# Altium footprint library Udemy_PCB_LIB.PcbLib: 35 footprints (part 1 of 3)
Each footprint in its own frame and in the unit in brackets; x right, y up, seen from the top. Pads: shape width x height; smd on the part's side, far side on the other; paste and mask are expansions set on the pad; w line width, h text height; cw(c..) or ccw(c..) is an arc to the next point about the centre after c.
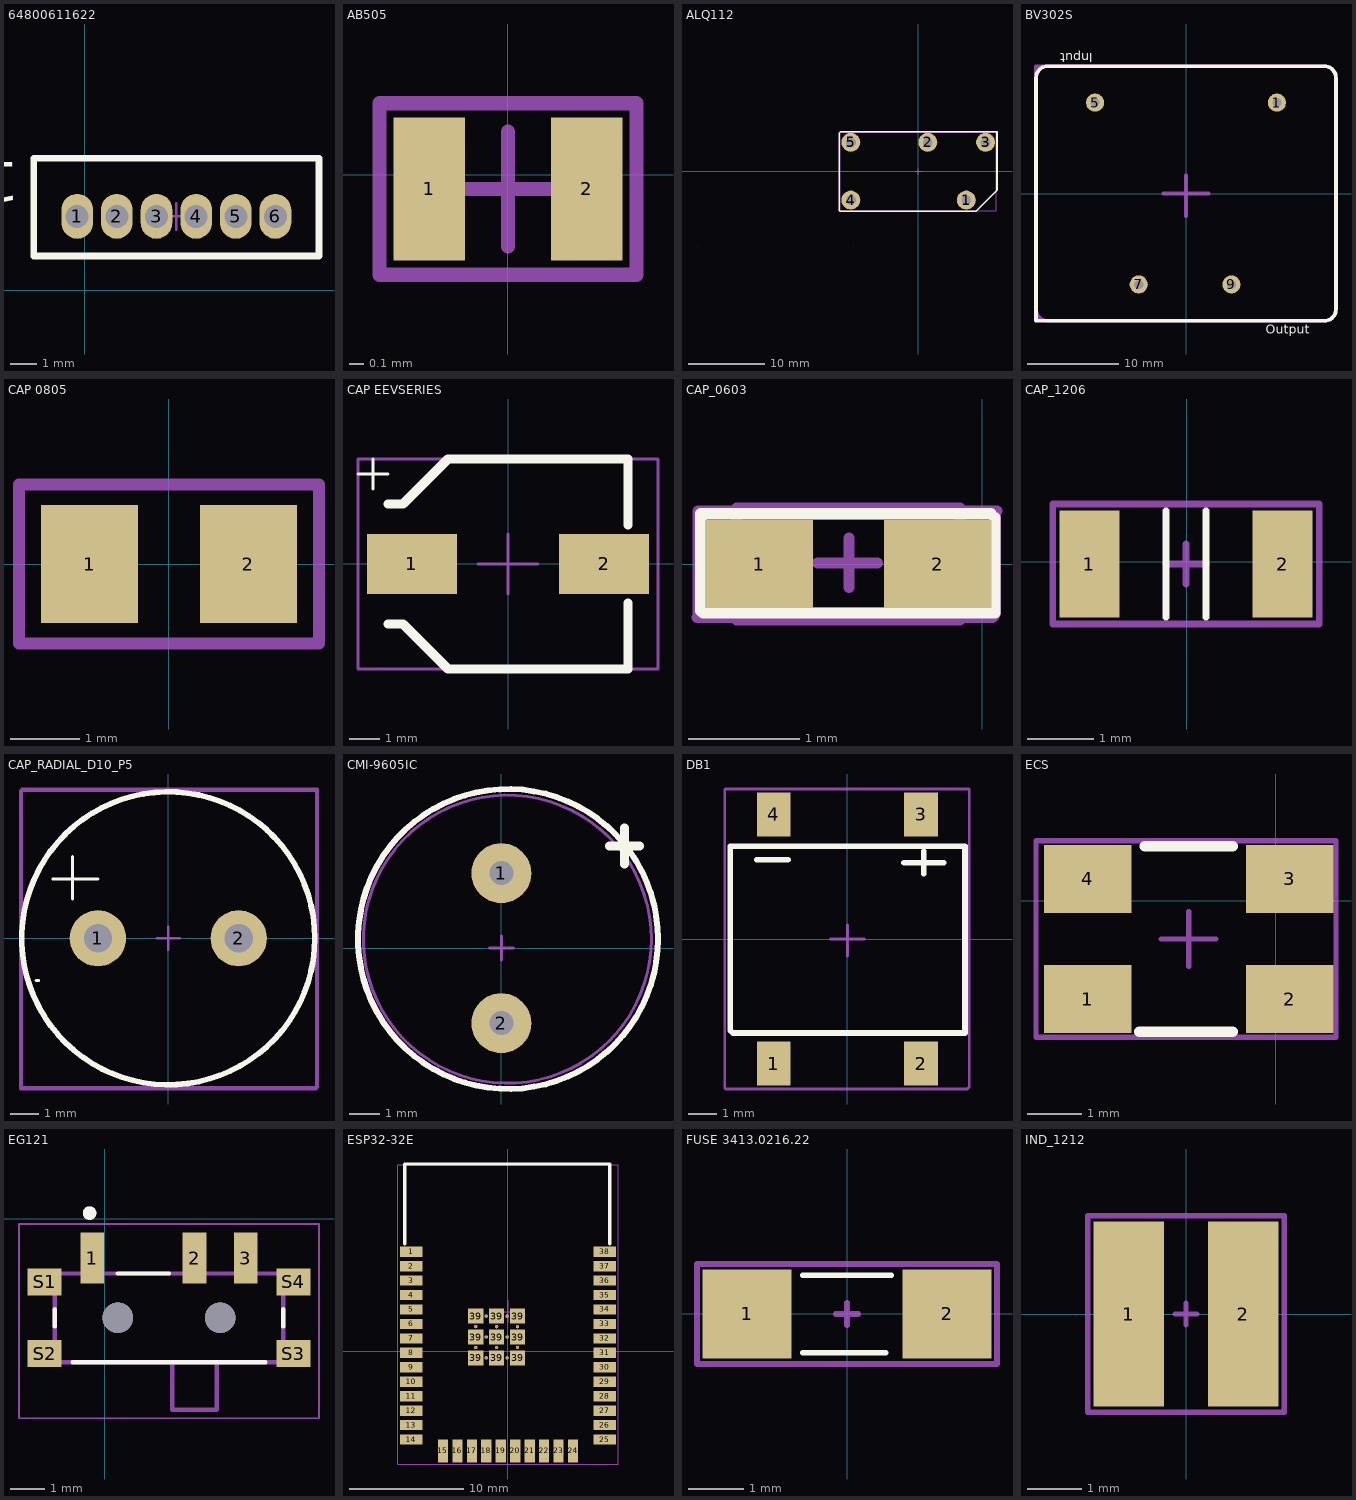
[diagram p0: the footprints below, top view; thin cyan lines are the x and y axes]

## 64800611622 [mm]
pads (6):
  oval 1.2x1.7 hole 0.87 mask+0.05: 1(-0.289,2.798) 2(1.211,2.798) 3(2.711,2.798) 4(4.211,2.798) 5(5.711,2.798) 6(7.211,2.798)
Top Overlay:
  lines w0.25: -1.939,1.298 -1.939,4.998 8.861,4.998 8.861,1.298 -1.939,1.298
  text "1" at -2.493,4.844 h1.52
Top 3D Body:
  lines w0.1: 2.961,2.798 3.961,2.798 ; 3.461,2.298 3.461,3.298 ; -1.939,1.298 8.861,1.298 8.861,4.998 -1.939,4.998 -1.939,1.298
Bottom Designator:
  lines w0.1: -1.939,1.298 -1.939,4.998 8.861,4.998 8.861,1.298 -1.939,1.298
  text "'.Designator'" at -0.585,2.56 h1.52
3D body "64800611622 (rev1).stp": height 4.75, standoff -2.45, extent -1.789,1.398 8.711,4.898

## AB505 [mm]
pads (2):
  rect 0.5x1 smd mask+0.05: 1(-0.55,-0.1) 2(0.55,-0.1)
Top 3D Body:
  lines w0.1: -0.4,-0.1 0.4,-0.1 ; 0,-0.5 0,0.3 ; -0.9,-0.7 0.9,-0.7 0.9,0.5 -0.9,0.5 -0.9,-0.7
Bottom Designator:
  lines w0.1: -0.9,-0.7 0.9,-0.7 0.9,0.5 -0.9,0.5 -0.9,-0.7
  text "'.Designator'" at -1,-0.467 h0.7
3D body "ABS05.STEP": height 0.5, standoff 0, extent -0.8,-0.6 0.8,0.4

## ALQ112 [mm]
pads (5):
  round 2.5 hole 1.3: 1(6.35,-3.81) 2(1.27,3.81) 3(8.89,3.81) 4(-8.89,-3.81) 5(-8.89,3.81)
Top Overlay:
  lines w0.2: -10.4,5.1 -10.4,-5.2 -10.3,-5.3 7.6,-5.3 10.4,-2.5 10.4,5.2 -10.3,5.2
Top Component Center:
  lines w0.1: -29.19,-9.89 -29.187,-9.893 ; -8.593,-9.893 -8.59,-9.89 ; -0.3,0 0.2,0 ; 0,-0.3 0,0.3 ; -10.29,-5.19 -10.287,-5.193 10.307,-5.193 10.31,-5.19 10.31,5.11 -9.99,5.11 -10.29,5.11 -10.29,-5.19
Top Designator:
  lines w0.1: -10.29,-5.19 -10.29,5.11 -9.99,5.11 10.31,5.11 10.31,-5.19 ; -10.287,-5.193 10.307,-5.193 ; -0.4,0 0.5,0 ; 0,-0.4 0,0.3
  text ".Designator" at -5.746,-0.438 h1.52
3D body: height 15.6, standoff 0.4, extent 8.01,-3.99 9.01,-2.99
3D body: height 0.45, standoff -3.75, extent -9.29,3.41 -8.49,4.21
3D body: height 0.45, standoff -3.75, extent -9.29,-4.21 -8.49,-3.41
3D body: height 0.2, standoff -4, extent -8.89,3.81 -8.09,3.81
3D body: height 0.2, standoff -4, extent 0.87,3.66 1.67,3.96
3D body: height 0.2, standoff -4, extent 0.87,3.96 1.67,4.26
3D body: height 0.2, standoff -4, extent 8.49,3.66 9.29,3.96
3D body: height 0.2, standoff -4, extent 5.95,-3.96 6.75,-3.66
3D body: height 15.6, standoff 0.4, extent -10,-5 10,5

## BV302S [mm]
pads (4):
  round 2 hole 1: 1(10,10) 5(-10,10) 7(-5.2,-10) 9(5,-10)
Top Overlay:
  lines w0.4: -16.5,-14 15.23,-14 ccw(c15.23,-12.73) 16.5,-12.73 16.5,12.73 ccw(c15.23,12.73) 15.23,14 -15.23,14 ccw(c-15.23,12.73) -16.5,12.73 -16.5,-14
  text "Output" at 8.754,-15.413 h1
  text "Input" at -10.254,15.413 h1
Top Component Center:
  lines w0.1: -16.5,-12.73 ccw(c-15.23,-12.73) -15.23,-14 15.23,-14 ccw(c15.23,-12.73) 16.5,-12.73 16.5,12.73 ccw(c15.23,12.73) 15.23,14 -16,14 ccw(c-16,13.5) -16.5,13.5 -16.5,-12.73
  lines w0.4: -2.5,0 2.5,0 ; 0,-2.5 0,2
Top Designator:
  lines w0.4: -16.5,-12.73 ccw(c-15.23,-12.73) -15.23,-14 15.23,-14 ccw(c15.23,-12.73) 16.5,-12.73 16.5,12.73 ccw(c15.23,12.73) 15.23,14 -16.5,14 -16.5,-12.73
  text ".Designator" at -8.1,-1.1 h3
3D body "User Library-Hahn BV EI 302 2902.step": height 21.8, standoff -4.5, extent -16.25,-13.75 16.25,13.75

## CAP 0805 [mm]
pads (2):
  rect 1.4x1.7 smd: 1(-1.143,0) 2(1.143,0)
Mechanical 13:
  lines w0.175: -2.159,-1.143 -2.159,1.143 2.159,1.143 2.159,-1.143 -2.159,-1.143
  text "'.Designator'" at -5.665,-0.417 h1
3D body "C0805.stp": height 1.01, standoff 0.01, extent -1.15,-0.762 1.15,0.788

## CAP EEVSERIES [mm]
pads (2):
  rect 3x2 smd mask+0.05: 1(-3.2,0) 2(3.2,0)
Top Overlay:
  lines w0.1: -5,3 -4,3 ; -4.5,2.5 -4.5,3.5
  lines w0.3: -4,-2 -3.5,-2 -2,-3.5 -1.5,-3.5 4,-3.5 4,-1.3 ; -4,2 -3.5,2 -2,3.5 -1.5,3.5 4,3.5 4,1.3
Top Component Center:
  lines w0.1: -2,3.5 5,3.5 5,-3.5 -5,-3.5 -5,3.5 3.5,3.5 ; -1,0 1,0 ; 0,-1 0,-0.5 0,0.5 0,1
  text ".Designator" at -4.2,-1.134 h1.7
Top Designator:
  lines w0.1: -2,3.5 5,3.5 5,-3.5 -5,-3.5 -5,3.5 3.5,3.5
3D body "EEV686M035A9HAA.step": height 8.01, standoff 0, extent -3.8,-3.4 3.8,3.4

## CAP_0603 [mil]
pads (2):
  rect 38x31 smd mask+1.97: 1(-78.74,0) 2(-15.74,0)
Top Overlay:
  lines w3.94: 3.06,17.7 -99.34,17.7 -99.34,-16.5 -98.54,-17.3 4.46,-17.3 4.46,16.3
Top Component Center:
  lines w3.94: -58.04,0.3 -37.04,0.3 ; -47.04,-8.3 -47.04,9.1 ; -99.64,-17.3 4.46,-17.3 4.66,-17.5 4.66,17.5 4.46,17.7 -99.04,17.7 -99.04,-16.7 -99.64,-17.3
Top 3D Body:
  lines w3.94: -86.61,-19.68 -86.61,19.68 -7.87,19.68 -7.87,-19.68 -86.61,-19.68
Top Designator:
  lines w3.94: -100.64,-18.9 -100.34,-18.6 -100.34,18.7 5.16,18.7 4.26,17.8 4.26,-18.2 3.56,-18.9 -100.64,-18.9
  text ".Designator" at -62.99,-9.19 h19.68
3D body "CAPC0603.STEP": height 32.28, standoff 0.79, extent -88.6,-22.22 -5.89,18.28

## CAP_1206 [mm]
pads (2):
  rect 0.9x1.6 smd mask+0.05: 1(-1.46,-0.032) 2(1.44,-0.032)
Top Overlay:
  lines w0.1: -0.31,-0.832 -0.31,0.768 ; 0.29,-0.832 0.29,0.768
Top Component Center:
  lines w0.1: -0.31,-0.032 0.29,-0.032 ; -0.01,-0.332 -0.01,0.268 ; -2.01,-0.932 1.99,-0.932 1.99,0.868 -2.01,0.868 -2.01,-0.932
Top Designator:
  lines w0.1: -2.01,-0.932 1.99,-0.932 1.99,0.868 -2.01,0.868 -2.01,-0.932
  text "'.Designator'" at -1.26,-0.349 h0.7
3D body "CAPC1206.STEP": height 1.3, standoff -0.01, extent -1.984,-1.008 1.965,0.944

## CAP_RADIAL_D10_P5 [mm]
pads (2):
  round 2 hole 1: 1(-2.5,0) 2(2.5,0)
Top Overlay:
  circle w0.2: c0,0 r5.2
  lines w0.1: -4.7,-1.5 -4.6,-1.5 ; -4.1,2.1 -2.5,2.1 ; -3.4,1.4 -3.4,2.9
Top Component Center:
  lines w0.1: -0.4,0 0.4,0 ; 0,-0.4 0,0.4 ; -5.2,-5.3 -5.2,5.3 5.3,5.3 5.3,-5.3 -5.2,-5.3
  text ".Designator" at -2.55,-2.283 h1.4
Top Designator:
  lines w0.1: -5.25,-5.35 -5.25,5.25 5.25,5.25 5.25,-5.35 -5.25,-5.35
3D body "ESH477M050AH4AA.step": height 22.21, standoff -19.8, extent -5.2,-5.3 5.3,5.2

## CMI-9605IC [mm]
pads (2):
  round 2 hole 0.8: 1(0,2.5) 2(0,-2.5)
Top Overlay:
  circle w0.2: c0.222,0.307 r5
  lines w0.3: 3.6,3.4 4.6,3.4 ; 4.1,2.8 4.1,4
Top Component Center:
  circle w0.1: c0.2,0.3 r4.8
  lines w0.1: -0.4,0 0.4,0 ; 0,-0.4 0,0.4
  text ".Designator" at -2.446,-0.438 h1.52
Top Designator:
  circle w0.1: c0.2,0.3 r4.8
  lines w0.1: -0.4,0 0.4,0 ; 0,-0.4 0,0.4
3D body: height 5.06, standoff 5.05, extent -2,2 2,6
3D body: height 5.1, standoff 5.05, extent -4.035,-4.11 4.565,4.49
3D body: height 1.65, standoff -3.85, extent -0.3,-2.8 0.3,-2.2
3D body: height 0.15, standoff -5.35, extent -0.3,2.2 0.3,2.8
3D body: height 0.15, standoff -5.35, extent -0.3,2.2 0.3,2.8
3D body: height 0.15, standoff -5.35, extent -0.3,2.2 0.3,2.8
3D body: height 5, standoff 0, extent -4.6,-4.5 5,5.1

## DB1 [mm]
pads (4):
  rect 1.2x1.55 smd mask+0.05: 1(-2.605,-4.4) 2(2.605,-4.4) 3(2.605,4.4) 4(-2.605,4.4)
Top Overlay:
  lines w0.2: -3.2,2.8 -2.1,2.8 ; 2,2.7 3.4,2.7 ; 2.7,2.3 2.7,3.1 ; -4.147,-3.222 -4.047,-3.322 4.153,-3.322 4.153,3.278 -4.147,3.278 -4.147,-3.222
Top Component Center:
  lines w0.1: -0.6,0 0.6,0 ; 0,-0.6 0,0.5 ; 4.2,-5.3 -4.3,-5.3 -4.334,-5.266 -4.334,5.066 -4.334,5.281 -4.315,5.3 -4.2,5.3 -2.1,5.3 2.1,5.3 4.2,5.3 4.283,5.3 4.3,5.282 4.3,-5.233 4.233,-5.3
Top Designator:
  lines w0.1: -0.6,0 0.5,0 ; 0,-0.6 0,0.5 ; 4.2,-5.3 -4.3,-5.3 -4.334,-5.266 -4.334,5.066 -4.334,5.281 -4.315,5.3 -4.2,5.3 -2.1,5.3 2.1,5.3 4.2,5.3 4.283,5.3 4.3,5.282 4.3,-5.233 4.233,-5.3
  text ".Designator" at -3.146,-0.638 h1.52
3D body "User Library-DB107S  DB-S.step": height 2.66, standoff 0, extent -4.16,-5.2 4.16,5.2

## ECS [mm]
pads (4):
  rect 1.6x1.25 smd mask+0.05: 1(-3.45,-1.8) 2(0.25,-1.8) 3(0.25,0.4) 4(-3.45,0.4)
Top Overlay:
  lines w0.2: -2.5,-2.4 -0.8,-2.4 ; -2.4,1 -0.8,1
Top 3D Body:
  lines w0.1: -2.1,-0.7 -1.1,-0.7 ; -1.6,-1.2 -1.6,-0.2 ; -4.4,-2.5 1.1,-2.5 1.1,1.1 -4.4,1.1 -4.4,-2.5
Bottom Designator:
  lines w0.1: -4.4,-2.5 1.1,-2.5 1.1,1.1 -4.4,1.1 -4.4,-2.5
  text "'.Designator'" at -3.846,-1.338 h1.52
3D body "ECS-160-20-30B-TR.STEP": height 0.85, standoff 0, extent -4.1,-2.3 0.9,0.9

## EG121 [mm]
pads (9):
  rect 0.7x1.5 smd: 1(-0.365,-1.158) 2(2.635,-1.158) 3(4.135,-1.158)
  rect 1x0.8 smd: S1(-1.765,-1.858) S2(-1.765,-3.958) S3(5.535,-3.958) S4(5.535,-1.858)
  round 0.9 hole 0.9 unplated: ""(0.385,-2.908) ""(3.385,-2.908)
Top Overlay:
  circle w0.2: c-0.444,0.163 r0.1
  lines w0.127: -1.465,-3.162 -1.465,-2.654 ; -0.945,-4.208 4.715,-4.208 ; 0.385,-1.608 1.885,-1.608 ; 5.235,-3.162 5.235,-2.654
Mechanical 13:
  circle w0.2: c-0.444,0.163 r0.1
  lines w0.127: 1.985,-4.208 -1.465,-4.208 -1.465,-1.608 5.235,-1.608 5.235,-4.208 3.285,-4.208 ; 1.985,-4.208 1.985,-5.608 3.285,-5.608 3.285,-4.208 ; 1.985,-4.208 3.285,-4.208
Mechanical 15:
  lines w0.05: -2.515,-5.858 -2.515,-0.158 6.285,-0.158 6.285,-5.858 -2.515,-5.858
3D body "step_temp.STEP": height 1.4, standoff -0.3, extent -1.9,-5.65 5.8,-0.75

## ESP32-32E [mm]
pads (59):
  rect 2x0.9 smd mask+0.05: 1(-8.5,8.755) 2(-8.5,7.485) 3(-8.5,6.215) 4(-8.5,4.945) 5(-8.5,3.675) 6(-8.5,2.405) 7(-8.5,1.135) 8(-8.5,-0.135) 9(-8.5,-1.405) 10(-8.5,-2.675) 11(-8.5,-3.945) 12(-8.5,-5.215) 13(-8.5,-6.485) 14(-8.5,-7.755) 25(8.5,-7.755) 26(8.5,-6.485) 27(8.5,-5.215) 28(8.5,-3.945) 29(8.5,-2.675) 30(8.5,-1.405) 31(8.5,-0.135) 32(8.5,1.135) 33(8.5,2.405) 34(8.5,3.675) 35(8.5,4.945) 36(8.5,6.215) 37(8.5,7.485) 38(8.5,8.755)
  rect 0.9x2 smd mask+0.05: 15(-5.715,-8.755) 16(-4.445,-8.755) 17(-3.175,-8.755) 18(-1.905,-8.755) 19(-0.635,-8.755) 20(0.635,-8.755) 21(1.905,-8.755) 22(3.175,-8.755) 23(4.445,-8.755) 24(5.715,-8.755)
  rect 1.33x1.33 smd mask+0.05: 39(-2.835,-0.58) 39(-2.835,1.255) 39(-2.835,3.09) 39(-1,-0.58) 39(-1,1.255) 39(-1,3.09) 39(0.835,-0.58) 39(0.835,1.255) 39(0.835,3.09)
  round 0.3 hole 0.2 mask+0.05: 39(-2.835,0.338) 39(-2.835,2.173) 39(-1.917,-0.58) 39(-1.917,1.255) 39(-1.917,3.09) 39(-1,0.338) 39(-1,2.173) 39(-0.082,-0.58) 39(-0.082,1.255) 39(-0.082,3.09) 39(0.835,0.338) 39(0.835,2.173)
Top Overlay:
  lines w0.3: -9.071,9.463 -9.071,16.463 8.929,16.463 8.929,9.463
Top 3D Body:
  lines w0.1: -1,3.495 1,3.495 ; 0,2.495 0,4.495 ; -9.7,-9.905 -9.7,16.395 9.7,16.395 9.7,-9.905 -9.7,-9.905
Bottom Designator:
  lines w0.1: -9.7,-9.905 -9.7,16.395 9.7,16.395 9.7,-9.905 -9.7,-9.905
  text ".Designator" at -3.846,4.257 h1.52
3D body "ESP-32 .step": height 2.61, standoff -0.1, extent -8.95,-9 8.95,16.4

## FUSE 3413.0216.22 [mm]
pads (2):
  rect 1.6x1.6 smd: 1(-1.8,0) 2(1.8,0)
Top Overlay:
  lines w0.1: -0.8,-0.7 0.7,-0.7 ; -0.8,0.7 0.8,0.7
Top Component Center:
  lines w0.1: -0.2,0 0.2,0 ; 0,-0.2 0,0.2 ; -2.7,-0.9 2.7,-0.9 2.7,0.9 -2.7,0.9 -2.7,-0.9
Top Designator:
  lines w0.1: -2.7,-0.9 2.7,-0.9 2.7,0.9 -2.7,0.9 -2.7,-0.9
  text ".Designator" at -1.2,-0.133 h0.5
3D body "FUS1206_24N_SCH.step": height 0.61, standoff 0, extent -1.6,-0.8 1.6,0.8

## IND_1212 [mm]
pads (2):
  rect 1.3x3.4 smd mask+0.05: 1(-1.05,0) 2(1.05,0)
Top Component Center:
  lines w0.1: -0.2,0 0.2,0 ; 0,-0.2 0,0.2 ; -1.8,-1.8 1.8,-1.8 1.8,1.8 -1.8,1.8 -1.8,-1.8
  text ".Designator" at -1.2,-0.634 h1.7
Top Designator:
  lines w0.1: -1.8,-1.8 1.8,-1.8 1.8,1.8 -1.8,1.8 -1.8,-1.8
3D body "78438335010_Download_STP_WE-MAIA-3015_rev1.stp": height 1.2, standoff 0, extent -1.5,-1.5 1.5,1.5